# Altium footprint library THU.PcbLib: 477 footprints (part 24 of 30)
Each footprint in its own frame and in the unit in brackets; x right, y up, seen from the top. Pads: shape width x height; smd on the part's side, far side on the other; paste and mask are expansions set on the pad; w line width, h text height; cw(c..) or ccw(c..) is an arc to the next point about the centre after c.
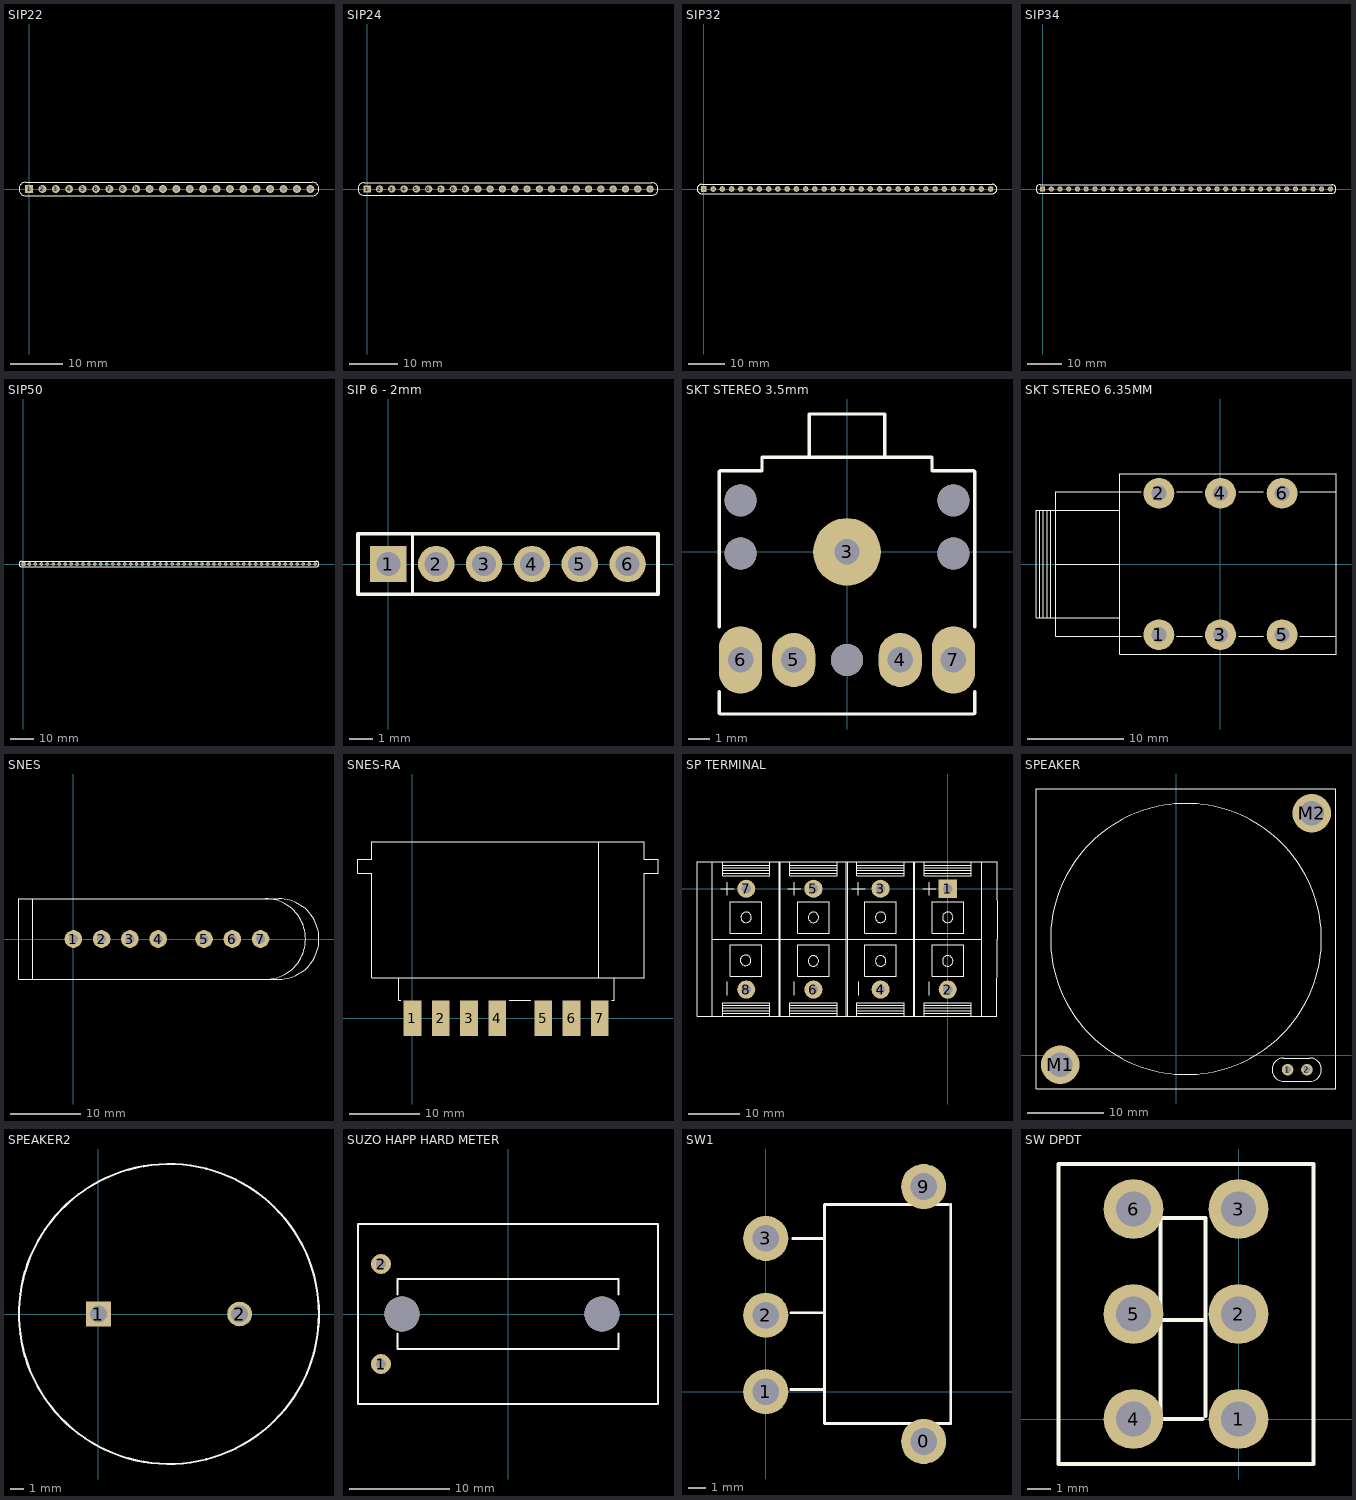
[diagram p23: the footprints below, top view; thin cyan lines are the x and y axes]

## SIP22 [mil]
pads (22):
  rect 60x60 hole 34: 1(0,0)
  round 60 hole 34: 2(100,0) 3(200,0) 4(300,0) 5(400,0) 6(500,0) 7(600,0) 8(700,0) 9(800,0) 10(900,0) 11(1000,0) 12(1100,0) 13(1200,0) 14(1300,0) 15(1400,0) 16(1500,0) 17(1600,0) 18(1700,0) 19(1800,0) 20(1900,0) 21(2000,0) 22(2100,0)
TopOverlay:
  lines w6: -25,-50 2115,-50 ccw(c2115,0) 2115,50 -25,50 ccw(c-25,0) -25,-50

## SIP24 [mil]
pads (24):
  rect 60x60 hole 34: 1(0,0)
  round 60 hole 34: 2(100,0) 3(200,0) 4(300,0) 5(400,0) 6(500,0) 7(600,0) 8(700,0) 9(800,0) 10(900,0) 11(1000,0) 12(1100,0) 13(1200,0) 14(1300,0) 15(1400,0) 16(1500,0) 17(1600,0) 18(1700,0) 19(1800,0) 20(1900,0) 21(2000,0) 22(2100,0) 23(2200,0) 24(2300,0)
TopOverlay:
  lines w6: -25,-50 cw(c-25,0) -25,50 2315,50 cw(c2315,0) 2315,-50 -25,-50

## SIP32 [mil]
pads (32):
  rect 60x60 hole 34: 1(0,0)
  round 60 hole 34: 2(100,0) 3(200,0) 4(300,0) 5(400,0) 6(500,0) 7(600,0) 8(700,0) 9(800,0) 10(900,0) 11(1000,0) 12(1100,0) 13(1200,0) 14(1300,0) 15(1400,0) 16(1500,0) 17(1600,0) 18(1700,0) 19(1800,0) 20(1900,0) 21(2000,0) 22(2100,0) 23(2200,0) 24(2300,0) 25(2400,0) 26(2500,0) 27(2600,0) 28(2700,0) 29(2800,0) 30(2900,0) 31(3000,0) 32(3100,0)
TopOverlay:
  lines w6: -25,-50 cw(c-25,0) -25,50 3120,50 cw(c3120,0) 3120,-50 -25,-50

## SIP34 [mil]
pads (34):
  rect 60x60 hole 34: 1(0,0)
  round 60 hole 34: 2(100,0) 3(200,0) 4(300,0) 5(400,0) 6(500,0) 7(600,0) 8(700,0) 9(800,0) 10(900,0) 11(1000,0) 12(1100,0) 13(1200,0) 14(1300,0) 15(1400,0) 16(1500,0) 17(1600,0) 18(1700,0) 19(1800,0) 20(1900,0) 21(2000,0) 22(2100,0) 23(2200,0) 24(2300,0) 25(2400,0) 26(2500,0) 27(2600,0) 28(2700,0) 29(2800,0) 30(2900,0) 31(3000,0) 32(3100,0) 33(3200,0) 34(3300,0)
TopOverlay:
  lines w6: 3315,-50 ccw(c3315,0) 3315,50 ; 3325,-50 -25,-50 cw(c-25,0) -25,50 3325,50

## SIP50 [mil]
pads (50):
  rect 60x60 hole 34: 1(0,0)
  round 60 hole 34: 2(100,0) 3(200,0) 4(300,0) 5(400,0) 6(500,0) 7(600,0) 8(700,0) 9(800,0) 10(900,0) 11(1000,0) 12(1100,0) 13(1200,0) 14(1300,0) 15(1400,0) 16(1500,0) 17(1600,0) 18(1700,0) 19(1800,0) 20(1900,0) 21(2000,0) 22(2100,0) 23(2200,0) 24(2300,0) 25(2400,0) 26(2500,0) 27(2600,0) 28(2700,0) 29(2800,0) 30(2900,0) 31(3000,0) 32(3100,0) 33(3200,0) 34(3300,0) 35(3400,0) 36(3500,0) 37(3600,0) 38(3700,0) 39(3800,0) 40(3900,0) 41(4000,0) 42(4100,0) 43(4200,0) 44(4300,0) 45(4400,0) 46(4500,0) 47(4600,0) 48(4700,0) 49(4800,0) 50(4900,0)
TopOverlay:
  lines w6: 4915,-50 ccw(c4915,0) 4915,50 ; 4925,-50 -25,-50 cw(c-25,0) -25,50 4925,50

## SIP 6 - 2mm [mil] "Name Type Description Vault Item Revision    SIP 6 - 2mm Footprint HARWIN - M22-2510605 - BOARD-BOARD CONNECTOR HEADER, 6WAY, 1ROW"
height 196.85
pads (6):
  rect 60x60 hole 39.37: 1(0,0)
  round 60 hole 39.37: 2(78.74,0) 3(157.48,0) 4(236.22,0) 5(314.96,0) 6(393.7,0)
TopOverlay:
  lines w5: 40,-50 40,50
  lines w6: -50,-50 -50,50 443.7,50 443.7,-50 -50,-50

## SKT STEREO 3.5mm [mm] "MIC SOCKET"
pads (10):
  round 3.175 hole 1.194: 3(0,0)
  oval 2.032x2.54 hole 1.194: 4(2.5,-5.08) 5(-2.5,-5.08)
  oval 2.032x3.175 hole 1.194: 6(-5,-5.08) 7(5,-5.08)
  round 1.5 hole 1.5 unplated: ""(-5,-0.08) ""(-5,2.42) ""(0,-5.08) ""(5,-0.08) ""(5,2.42)
TopOverlay:
  lines w0.152: -6,-7.589 -6,-6.573 ; -6,-3.525 -6,0 -6,3.779 -5.969,3.81 -4,3.81 -4,4.445 0,4.445 4,4.445 4,3.81 5.969,3.81 6,3.779 6,0 6,-3.525 ; -5.969,-7.62 0,-7.62 5.969,-7.62 6,-7.589 6,-6.573 ; -1.778,4.445 -1.778,6.477 0,6.477 1.778,6.477 1.778,4.445

## SKT STEREO 6.35MM [mm] "AUX SOCKET P/N 4803.2320"
height 16.3
pads (6):
  round 3.2 hole 1.6: 1(-6.4,-7.35) 2(-6.4,7.35) 3(0,-7.35) 4(0,7.35) 5(6.4,-7.35) 6(6.4,7.35)
TopOverlay:
  lines w0.127: -18.796,-5.6 -18.796,5.6 ; -18.415,-5.6 -18.415,5.6 ; -18.034,-5.6 -18.034,5.6 ; -17.653,-5.6 -17.653,5.6 ; -17.145,0 -10.489,0 ; -10.489,-5.6 -19.192,-5.6 -19.192,0 -19.192,5.6 -10.489,5.6 ; -8.255,-7.493 -10.489,-7.493 -17.145,-7.493 -17.145,7.493 -10.489,7.493 -8.255,7.493 ; -4.572,-7.493 -1.905,-7.493 ; -4.572,7.493 -1.905,7.493 ; 1.905,-7.493 4.445,-7.493 ; 1.905,7.493 4.445,7.493 ; 8.255,-7.493 12.015,-7.493 ; 8.255,7.493 12.015,7.493 ; -10.489,-9.4 -10.489,9.4 12.015,9.4 12.015,0 12.015,-9.4 -10.489,-9.4

## SNES [mm]
height 19.25
pads (7):
  round 2.5 hole 1.25: 1(0,0) 2(4,0) 3(8,0) 4(12,0) 5(18.5,0) 6(22.5,0) 7(26.5,0)
TopOverlay:
  lines w0.127: 0,5.715 -5.76,5.715 ; 27.155,-5.715 ccw(c27.157,0) 27.155,5.715 ; -5.76,-5.715 -5.76,0 -5.76,5.715 ; -5.76,-5.715 29.058,-5.715 ccw(c29.06,0) 29.058,5.715 -5.76,5.715 ; -5.76,-5.715 -7.7,-5.715 -7.7,0 -7.7,5.715 -5.76,5.715

## SNES-RA [mm]
pads (7):
  rect 2.5x5 smd: 1(0,0) 2(4,0) 3(8,0) 4(12,0) 5(18.5,0) 6(22.5,0) 7(26.5,0)
TopOverlay:
  lines w0.127: -1.905,5.715 -1.905,2.54 -1.651,2.54 ; 0,5.715 -5.76,5.715 ; 13.716,2.54 16.764,2.54 ; 26.371,5.715 26.371,24.95 ; 28.194,2.54 28.575,2.54 28.575,5.715 ; -5.76,5.715 -5.76,20.5 -7.7,20.5 -7.7,22.5 -5.76,22.5 -5.76,24.95 32.79,24.95 32.79,22.5 34.73,22.5 34.73,20.5 32.79,20.5 32.79,5.715 -5.76,5.715

## SP TERMINAL [mm]
pads (8):
  rect 3.5x3.5 hole 1.8: 1(0,0)
  round 3.5 hole 1.8: 2(0,-19.5) 3(-13,0) 4(-13,-19.5) 5(-26,0) 6(-26,-19.5) 7(-39,0) 8(-39,-19.5)
TopOverlay:
  circle w0.152: c-39,-5.53 r1.016
  circle w0.152: c-26,-5.53 r1.016
  circle w0.152: c-13,-5.53 r1.016
  circle w0.152: c0,-5.53 r1.016
  circle w0.152: c-39.127,-13.843 r1.016
  circle w0.152: c-26,-13.97 r1.016
  circle w0.152: c-13,-13.97 r1.016
  circle w0.152: c0,-13.97 r1.016
  lines w0.152: -45.604,-24.707 -45.604,5.265 ; -45.604,-9.721 -39,-9.721 -32.396,-9.721 ; -43.953,0 -41.413,0 ; -43.572,-24.707 -43.572,-22.04 -34.428,-22.04 -34.428,-24.707 ; -43.572,-24.072 -34.428,-24.072 ; -43.572,-23.564 -34.428,-23.564 ; -43.572,-23.056 -34.428,-23.056 ; -43.572,-22.548 -34.428,-22.548 ; -43.572,3.048 -34.428,3.048 ; -43.572,3.556 -34.428,3.556 ; -43.572,4.064 -34.428,4.064 ; -43.572,4.572 -34.428,4.572 ; -43.572,5.207 -43.572,2.54 -34.428,2.54 -34.428,5.207 ; -42.683,-1.27 -42.683,1.27 ; -42.672,-20.574 -42.672,-18.034 ; -32.604,-24.707 -32.604,5.265 ; -32.604,-9.721 -26,-9.721 -19.396,-9.721 ; -32.396,-24.707 -32.396,5.265 ; -30.999,0 -28.459,0 ; -30.572,-24.707 -30.572,-22.04 -21.428,-22.04 -21.428,-24.707 ; -30.572,-24.072 -21.428,-24.072 ; -30.572,-23.564 -21.428,-23.564 ; -30.572,-23.056 -21.428,-23.056 ; -30.572,-22.548 -21.428,-22.548 ; -30.572,3.048 -21.428,3.048 ; -30.572,3.556 -21.428,3.556 ; -30.572,4.064 -21.428,4.064 ; -30.572,4.572 -21.428,4.572 ; -30.572,5.207 -30.572,2.54 -21.428,2.54 -21.428,5.207 ; -29.729,-1.27 -29.729,1.27 ; -29.718,-20.574 -29.718,-18.034 ; -19.604,-24.707 -19.604,5.265 ; -19.604,-9.721 -13,-9.721 -6.396,-9.721 ; -19.396,-24.707 -19.396,5.265 ; -18.553,0 -16.013,0 ; -17.572,-24.707 -17.572,-22.04 -8.428,-22.04 -8.428,-24.707 ; -17.572,-24.072 -8.428,-24.072 ; -17.572,-23.564 -8.428,-23.564 ; -17.572,-23.056 -8.428,-23.056 ; -17.572,-22.548 -8.428,-22.548 ; -17.572,3.048 -8.428,3.048 ; -17.572,3.556 -8.428,3.556 ; -17.572,4.064 -8.428,4.064 ; -17.572,4.572 -8.428,4.572 ; -17.572,5.207 -17.572,2.54 -8.428,2.54 -8.428,5.207 ; -17.283,-1.27 -17.283,1.27 ; -17.272,-20.574 -17.272,-18.034 ; -6.604,-24.707 -6.604,5.265 ; -6.604,-9.721 0,-9.721 6.604,-9.721 ; -6.396,-24.707 -6.396,5.265 ; -4.837,0 -2.297,0 ; -4.572,-24.707 -4.572,-22.04 4.572,-22.04 4.572,-24.707 ; -4.572,-24.072 4.572,-24.072 ; -4.572,-23.564 4.572,-23.564 ; -4.572,-23.056 4.572,-23.056 ; -4.572,-22.548 4.572,-22.548 ; -4.572,3.048 4.572,3.048 ; -4.572,3.556 4.572,3.556 ; -4.572,4.064 4.572,4.064 ; -4.572,4.572 4.572,4.572 ; -4.572,5.207 -4.572,2.54 4.572,2.54 4.572,5.207 ; -3.567,-1.27 -3.567,1.27 ; -3.556,-20.574 -3.556,-18.034 ; 6.604,-24.707 6.604,5.265 ; -48.525,-24.707 9.514,-24.707 9.525,-9.793 9.514,5.265 -48.525,5.265 -48.525,-9.848 -48.525,-24.707 ; -42.048,-16.96 -35.952,-16.96 -35.952,-10.864 -42.048,-10.864 -42.048,-16.96 ; -42.048,-8.636 -35.952,-8.636 -35.952,-2.54 -42.048,-2.54 -42.048,-8.636 ; -29.048,-16.96 -22.952,-16.96 -22.952,-10.864 -29.048,-10.864 -29.048,-16.96 ; -29.048,-8.636 -22.952,-8.636 -22.952,-2.54 -29.048,-2.54 -29.048,-8.636 ; -16.048,-16.96 -9.952,-16.96 -9.952,-10.864 -16.048,-10.864 -16.048,-16.96 ; -16.048,-8.636 -9.952,-8.636 -9.952,-2.54 -16.048,-2.54 -16.048,-8.636 ; -3.048,-16.96 3.048,-16.96 3.048,-10.864 -3.048,-10.864 -3.048,-16.96 ; -3.048,-8.636 3.048,-8.636 3.048,-2.54 -3.048,-2.54 -3.048,-8.636

## SPEAKER [mil]
pads (4):
  round 60 hole 34: 1(575,-75) 2(675,-75)
  round 200 hole 125: M1(-600,-50) M2(700,1250)
TopOverlay:
  circle w6: c50,600 r700
  lines w6: -725,-175 825,-175 825,1375 -725,1375 -725,-175 ; 555,-135 690,-135 ccw(c690,-75) 690,-15 555,-15 ccw(c555,-75) 555,-135

## SPEAKER2 [mil]
pads (2):
  rect 70x70 hole 49: 1(0,0)
  round 70 hole 49: 2(400,0)
TopOverlay:
  circle w6: c200,0 r425

## SUZO HAPP HARD METER [mm] "P/N 42-0754-12V"
height 41.5
pads (4):
  round 2 hole 1: 1(-12.7,-5) 2(-12.7,5)
  round 3.5 hole 3.5 unplated: ""(-10.6,0) ""(9.4,0)
TopOverlay:
  lines w0.152: -11.049,-1.905 -11.049,-3.5 0,-3.5 11.049,-3.5 11.049,-1.905 ; -11.049,1.905 -11.049,3.5 0,3.5 11.049,3.5 11.049,1.905 ; -15,-9 -15,9 15,9 15,-9 -15,-9

## SW1 [mil]
pads (5):
  round 100 hole 59: 0(350,-110) 1(0,0) 2(0,170) 3(0,340) 9(350,455)
TopOverlay:
  lines w6: 55,5 130,5 ; 55,175 130,175 ; 60,340 130,340 ; 405,415 130,415 130,175 ; 410,415 410,-70 130,-70 130,175

## SW DPDT [mil]
pads (6):
  round 100 hole 59: 1(0,0) 2(0,175) 3(0,350) 4(-175,0) 5(-175,175) 6(-175,350)
TopOverlay:
  lines w6: -130,165 -55,165 ; -60,0 -130,0 -130,335 -55,335 -55,5 ; -300,-75 -300,425 125,425 125,200 125,-75 -300,-75